# Altium footprint library OSHW_LuxonisMaster_20201223.PcbLib: 112 footprints (part 6 of 7)
Each footprint in its own frame and in the unit in brackets; x right, y up, seen from the top. Pads: shape width x height; smd on the part's side, far side on the other; paste and mask are expansions set on the pad; w line width, h text height; cw(c..) or ccw(c..) is an arc to the next point about the centre after c.
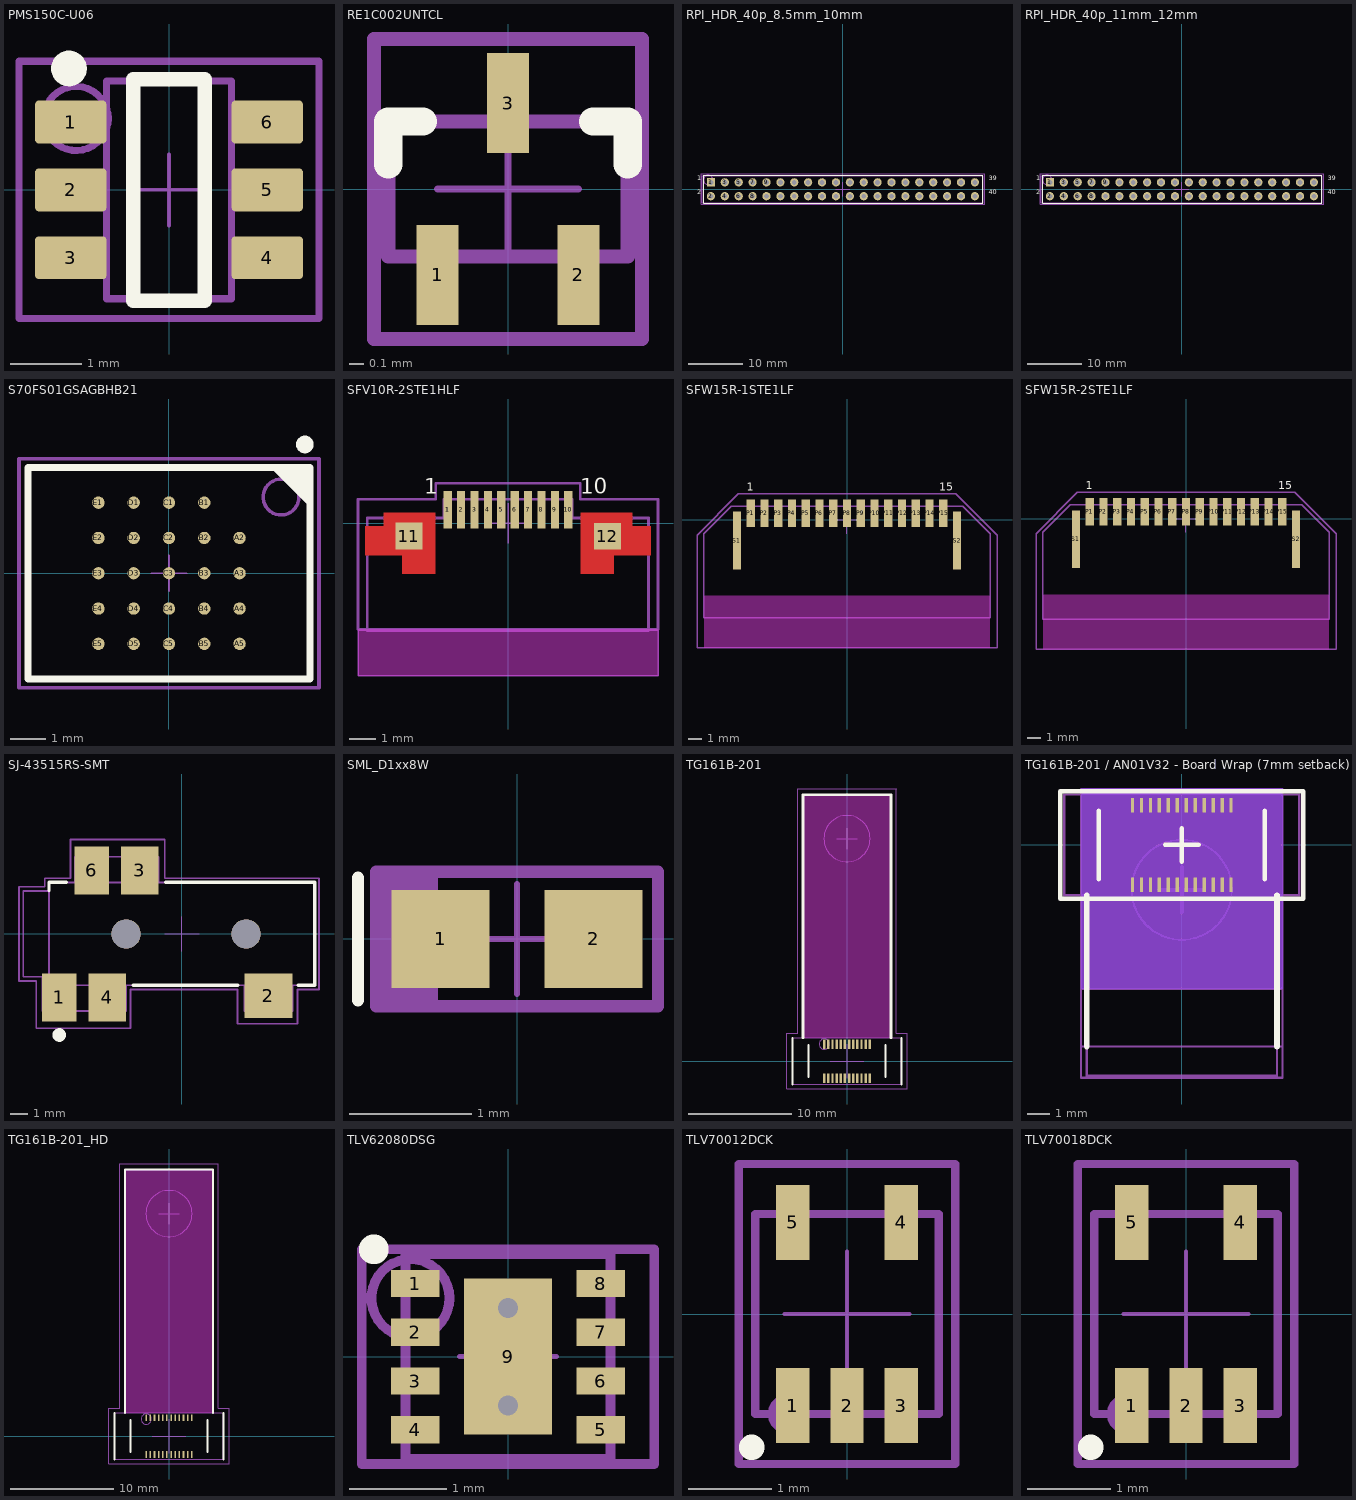
[diagram p5: the footprints below, top view; thin cyan lines are the x and y axes]

## PMS150C-U06 [mm] "SOT23-6 60mil"
height 1.524
pads (6):
  rrect17% 1x0.6 smd: 1(-1.375,0.95) 2(-1.375,0) 3(-1.375,-0.95) 4(1.375,-0.95) 5(1.375,0) 6(1.375,0.95)
Top Overlay:
  circle w0.25: c-1.4,1.7 r0.125
  lines w0.2: -0.5,-1.55 -0.5,1.55 0.5,1.55 0.5,-1.55 -0.5,-1.55
Top Assembly:
  circle w0.1: c-1.3,1 r0.449
  lines w0.1: -2.1,-1.8 -2.1,1.8 2.1,1.8 2.1,-1.8 -2.1,-1.8
  text ".Designator" at 0,0 h1
Top Courtyard:
  lines w0.05: -0.5,0 0.5,0 ; 0,-0.5 0,0.5 ; -2.1,-1.8 -2.1,1.8 2.1,1.8 2.1,-1.8 -2.1,-1.8
Top Component Outline:
  lines w0.1: -0.875,-1.525 -0.875,1.525 0.875,1.525 0.875,-1.525 -0.875,-1.525
3D body "DBV0006AakaMF06A.stp": height 1.11, standoff -0.01, extent -1.422,-1.461 1.422,1.46

## RE1C002UNTCL [mm] "ROHM SOT-416FL"
height 0.85
pads (3):
  rect 0.3x0.71 smd: 1(-0.5,-0.61) 2(0.5,-0.61) 3(0,0.61)
Top Overlay:
  lines w0.2: -0.85,0.175 -0.85,0.48 -0.605,0.48 ; 0.605,0.48 0.85,0.48 0.85,0.175
Top Assembly:
  lines w0.1: -0.95,-1.065 -0.95,1.065 0.95,1.065 0.95,-1.065 -0.95,-1.065
  text "'.Designator'" at 0,0 h1
Top Courtyard:
  lines w0.05: -0.5,0 0.5,0 ; 0,-0.5 0,0.5 ; -0.95,-1.065 0.95,-1.065 0.95,1.065 -0.95,1.065 -0.95,-1.065
Top Component Outline:
  lines w0.1: -0.85,-0.48 -0.85,0.48 0.85,0.48 0.85,-0.48 -0.85,-0.48
3D body "Trans_ROHM_RE1C002UNTCL_eec.STEP": height 0.25, standoff 0, extent -0.95,-1.065 0.95,1.065

## RPI_HDR_40p_8.5mm_10mm [mm] "RPI Header / 40pins / 8.5mm housing, / 10mm pin"
height 18.5
pads (40):
  rect 1.5x1.5 hole 0.9: 1(-24.13,1.27)
  round 1.5 hole 0.9: 2(-24.13,-1.27) 3(-21.59,1.27) 4(-21.59,-1.27) 5(-19.05,1.27) 6(-19.05,-1.27) 7(-16.51,1.27) 8(-16.51,-1.27) 9(-13.97,1.27) 10(-13.97,-1.27) 11(-11.43,1.27) 12(-11.43,-1.27) 13(-8.89,1.27) 14(-8.89,-1.27) 15(-6.35,1.27) 16(-6.35,-1.27) 17(-3.81,1.27) 18(-3.81,-1.27) 19(-1.27,1.27) 20(-1.27,-1.27) 21(1.27,1.27) 22(1.27,-1.27) 23(3.81,1.27) 24(3.81,-1.27) 25(6.35,1.27) 26(6.35,-1.27) 27(8.89,1.27) 28(8.89,-1.27) 29(11.43,1.27) 30(11.43,-1.27) 31(13.97,1.27) 32(13.97,-1.27) 33(16.51,1.27) 34(16.51,-1.27) 35(19.05,1.27) 36(19.05,-1.27) 37(21.59,1.27) 38(21.59,-1.27) 39(24.13,1.27) 40(24.13,-1.27)
Top Overlay:
  lines w0.2: -25.4,-2.54 -25.4,2.54 25.527,2.54 25.527,-2.54 -25.4,-2.54
  text "2" at -26.67,-1.27 h1.5
  text "40" at 26.67,-1.27 h1.5
  text "1" at -26.67,1.27 h1.5
  text "39" at 26.67,1.27 h1.5
Bottom Overlay:
  text "40" at 26.67,-1.27 h1.5
  text "39" at 26.67,1.27 h1.5
  text "2" at -26.67,-1.27 h1.5
  text "1" at -26.67,1.27 h1.5
Top Assembly:
  circle w0.1: c-24.6,1.7 r0.86
  lines w0.1: -25.9,2.6 -25.9,2.8 25.9,2.8 25.9,-2.7 -25.6,-2.7 -25.9,-2.7 -25.9,2.5 -25.9,2.7
  text "'.Designator'" at 0,0 h1
Top Courtyard:
  lines w0.05: -25.9,2.6 -25.9,2.8 25.9,2.8 25.9,-2.7 -25.6,-2.7 -25.9,-2.7 -25.9,2.5 -25.9,2.7 ; -1.27,0 0,0 ; 0,-1.27 0,0 ; 0,1.27 0,0 ; 1.27,0 0,0 ; 0,0 0,0
Top Component Outline:
  lines w0.1: -25.7,-2.5 -25.7,2.5 25.7,2.5 25.7,-2.5 -25.7,-2.5
3D body "SSQ-120-23-G-D.stp": height 8.51, standoff -10.01, extent -25.654,-2.477 25.654,2.477

## RPI_HDR_40p_11mm_12mm [mm] "RPI Header / 40pins / 11mm housing, / 12mm pin"
height 23
pads (40):
  rect 1.5x1.5 hole 0.9: 1(-24.13,1.27)
  round 1.5 hole 0.9: 2(-24.13,-1.27) 3(-21.59,1.27) 4(-21.59,-1.27) 5(-19.05,1.27) 6(-19.05,-1.27) 7(-16.51,1.27) 8(-16.51,-1.27) 9(-13.97,1.27) 10(-13.97,-1.27) 11(-11.43,1.27) 12(-11.43,-1.27) 13(-8.89,1.27) 14(-8.89,-1.27) 15(-6.35,1.27) 16(-6.35,-1.27) 17(-3.81,1.27) 18(-3.81,-1.27) 19(-1.27,1.27) 20(-1.27,-1.27) 21(1.27,1.27) 22(1.27,-1.27) 23(3.81,1.27) 24(3.81,-1.27) 25(6.35,1.27) 26(6.35,-1.27) 27(8.89,1.27) 28(8.89,-1.27) 29(11.43,1.27) 30(11.43,-1.27) 31(13.97,1.27) 32(13.97,-1.27) 33(16.51,1.27) 34(16.51,-1.27) 35(19.05,1.27) 36(19.05,-1.27) 37(21.59,1.27) 38(21.59,-1.27) 39(24.13,1.27) 40(24.13,-1.27)
Top Overlay:
  lines w0.2: -25.4,-2.54 -25.4,2.54 25.527,2.54 25.527,-2.54 -25.4,-2.54
  text "2" at -26.67,-1.27 h1.5
  text "40" at 26.67,-1.27 h1.5
  text "1" at -26.67,1.27 h1.5
  text "39" at 26.67,1.27 h1.5
Bottom Overlay:
  text "40" at 26.67,-1.27 h1.5
  text "39" at 26.67,1.27 h1.5
  text "2" at -26.67,-1.27 h1.5
  text "1" at -26.67,1.27 h1.5
Top Assembly:
  circle w0.1: c-24.6,1.7 r0.86
  lines w0.1: -25.9,2.6 -25.9,2.8 25.9,2.8 25.9,-2.7 -25.6,-2.7 -25.9,-2.7 -25.9,2.5 -25.9,2.7
  text "'.Designator'" at 0,0 h1
Top Courtyard:
  lines w0.05: -25.9,2.6 -25.9,2.8 25.9,2.8 25.9,-2.7 -25.6,-2.7 -25.9,-2.7 -25.9,2.5 -25.9,2.7 ; -1.27,0 0,0 ; 0,-1.27 0,0 ; 0,1.27 0,0 ; 1.27,0 0,0 ; 0,0 0,0
Top Component Outline:
  lines w0.1: -25.7,-2.5 -25.7,2.5 25.7,2.5 25.7,-2.5 -25.7,-2.5
3D body "RPI_Header_ELEDIY_11mmHousing_12mmPins v1.step": height 11.49, standoff -11.56, extent -25.7,-2.5 25.7,2.5

## S70FS01GSAGBHB21 [mm] "BGA, 24-Leads, Body 6.00x8.00mmx1.20mm, Pitch 1.00mm"
height 1.2
pads (24):
  round 0.35 smd: A2(2,1) A3(2,0) A4(2,-1) A5(2,-2) B1(1,2) B2(1,1) B3(1,0) B4(1,-1) B5(1,-2) C1(0,2) C2(0,1) C3(0,0) C4(0,-1) C5(0,-2) D1(-1,2) D2(-1,1) D3(-1,0) D4(-1,-1) D5(-1,-2) E1(-2,2) E2(-2,1) E3(-2,0) E4(-2,-1) E5(-2,-2)
Top Overlay:
  circle w0.25: c3.85,3.65 r0.125
  region: 4,2 3,3 4,3
  lines w0.2: 3,3 4,2 ; -4,-3 -4,3 4,3 4,-3 -4,-3
Top Assembly:
  circle w0.1: c3.175,2.159 r0.508
  lines w0.1: -4.25,-3.25 -4.25,3.25 4.25,3.25 4.25,-3.25 -4.25,-3.25
  text "'.Designator'" at 0,0 h1
Top Courtyard:
  lines w0.05: -0.5,0 0.5,0 ; 0,-0.5 0,0.5 ; -4.25,-3.25 -4.25,3.25 4.25,3.25 4.25,-3.25 -4.25,-3.25
Top Component Outline:
  lines w0.1: -4,-3 -4,3 4,3 4,-3 -4,-3
3D body: height 1.2, standoff 0.2, extent -4,-3 4,3

## SFV10R-2STE1HLF [mm] "CONN FFC TOP 10POS 0.50MM R/A"
height 2
pads (13):
  rect 0.305x1.405 smd: 1(-2.258,0.494) 1(-2.258,0.494) 2(-1.759,0.494) 3(-1.258,0.494) 4(-0.758,0.494) 5(-0.258,0.494) 6(0.242,0.494) 7(0.741,0.494) 8(1.242,0.494) 9(1.742,0.494) 10(2.242,0.494)
  rect 1x1 smd: 11(-3.707,-0.486) 12(3.708,-0.494)
Top Layer:
  region: 3.942,0.395 2.692,0.395 2.692,-1.905 3.942,-1.905
  region: 5.342,-0.105 2.692,-0.105 2.692,-1.205 5.342,-1.205
  region: 4.642,0.395 2.692,0.395 2.692,-1.205 4.642,-1.205
  rectangle: -4.658,-1.205 -2.708,0.395
  rectangle: -5.358,-1.205 -2.708,-0.105
  rectangle: -3.958,-1.906 -2.708,0.395
  region: 4.346,2.653
  region: 5.215,-0.232
  region: -5.231,-0.232
Top Overlay:
  text "10" at 2.694,0.892 h1
  text "1" at -3.137,0.892 h1
Top Paste:
  region: 5.342,-0.105 2.692,-0.105 2.692,-1.205 5.342,-1.205
  region: 4.642,0.395 2.692,0.395 2.692,-1.205 4.642,-1.205
  region: 3.942,0.395 2.692,0.395 2.692,-1.905 3.942,-1.905
  rectangle: -5.358,-1.205 -2.708,-0.105
  rectangle: -4.658,-1.205 -2.708,0.395
  rectangle: -3.958,-1.906 -2.708,0.395
Keep-Out Layer:
  region: 5.594,-5.708 5.594,-3.973 -5.611,-3.973 -5.611,-5.708
Top Assembly:
  lines w0.1: -5.611,-3.973 -5.611,0.892 -2.711,0.892 -2.711,1.492 2.694,1.492 2.694,0.892 5.594,0.892 5.594,-3.973 -5.611,-3.973
  text "'.Designator'" at 0,0 h1
Assembly Notes:
  text "Top contact ffc" at -2.756,-3.708 h1
Top Courtyard:
  lines w0.05: -0.75,0 0,0 ; 0,-0.75 0,0 ; 0,0.75 0,0 ; 0.75,0 0,0 ; -5.611,-5.708 -5.611,0.892 -5.261,0.892 -2.711,0.892 -2.711,1.492 2.694,1.492 2.694,0.892 5.244,0.892 5.594,0.892 5.594,-5.708 -5.611,-5.708
Top Component Outline:
  lines w0.1: 5.239,0.192 5.239,-4.008 -5.261,-4.008 -5.261,0.192 -2.411,0.192 -2.411,0.892 2.394,0.892 2.394,0.192 5.244,0.192
3D body "ssfv10r_2stlf.stp": height 1.82, standoff -0.05, extent -5.261,-4.008 5.239,0.892

## SFW15R-1STE1LF [mm] "RPi Cam 15pin 2 lane MIPI bottom contact"
height 2.7
pads (17):
  rect 0.6x2 smd: P1(-7,0.5) P2(-6,0.5) P3(-5,0.5) P4(-4,0.5) P5(-3,0.5) P6(-2,0.5) P7(-1,0.5) P8(0,0.5) P9(1,0.5) P10(2,0.5) P11(3,0.5) P12(4,0.5) P13(5,0.5) P14(6,0.5) P15(7,0.5)
  rect 0.6x4.2 smd: S1(-8,-1.5) S2(8,-1.5)
Top Layer keep-out:
  rectangle: -10.4,-9.3 10.4,-5.5
Top Overlay:
  text "1" at -7.3,1.9 h1
  text "15" at 6.7,1.9 h1
Top Assembly:
  lines w0.1: -10.9,-9.3 10.9,-9.3 10.9,-1.1 7.9,1.9 -7.9,1.9 -10.9,-1.1 -10.9,-9.3
  text "'.Designator'" at 0,0 h1
Assembly Notes:
  text "Keepout: flex cable region" at -10.4,-9.3 h1
Top Courtyard:
  lines w0.05: -1,0 0,0 ; 0,-1 0,0 ; 0,1 0,0 ; 1,0 0,0 ; -10.9,-9.3 10.9,-9.3 10.9,-1.1 7.9,1.9 -7.9,1.9 -10.9,-1.1 -10.9,-9.3
Top Component Outline:
  lines w0.1: -10.4,-7.1 10.4,-7.1 10.4,-1 8.4,1 -8.4,1 -10.4,-1 -10.4,-7.1
  text "Slider open" at -10.1,-7.1 h1
3D body "ssfw15r_1_3st_lf.stp": height 2.7, standoff 0, extent -10.4,-5.5 10.4,1

## SFW15R-2STE1LF [mm] "RPi Cam 15pin 2 lane MIPI top contact"
height 2.7
pads (17):
  rect 0.6x2 smd: P1(-7,0.5) P2(-6,0.5) P3(-5,0.5) P4(-4,0.5) P5(-3,0.5) P6(-2,0.5) P7(-1,0.5) P8(0,0.5) P9(1,0.5) P10(2,0.5) P11(3,0.5) P12(4,0.5) P13(5,0.5) P14(6,0.5) P15(7,0.5)
  rect 0.6x4.2 smd: S1(-8,-1.5) S2(8,-1.5)
Top Layer keep-out:
  rectangle: -10.4,-9.5 10.4,-5.5
Top Overlay:
  text "1" at -7.3,1.9 h1
  text "15" at 6.7,1.9 h1
Top Assembly:
  lines w0.1: -10.9,-9.5 10.9,-9.5 10.9,-1.1 7.9,1.9 -7.9,1.9 -10.9,-1.1 -10.9,-9.5
  text "'.Designator'" at 0,0 h1
Assembly Notes:
  text "Keepout: flex cable region" at -10.4,-9.5 h1
Top Courtyard:
  lines w0.05: -1,0 0,0 ; 0,-1 0,0 ; 0,1 0,0 ; 1,0 0,0 ; -10.9,-9.5 10.9,-9.5 10.9,-1.1 7.9,1.9 -7.9,1.9 -10.9,-1.1 -10.9,-9.5
Top Component Outline:
  lines w0.1: -10.4,-7.3 10.4,-7.3 10.4,-1 8.4,1 -8.4,1 -10.4,-1 -10.4,-7.3
  text "Slider open" at -10.1,-7.1 h1
3D body "ssfw15r_2_4st_lf.stp": height 2.7, standoff 0, extent -10.4,-5.5 10.4,1

## SJ-43515RS-SMT [mm] "CUI_SJ-43515RS-SMT"
pads (7):
  rect 2x2.8 smd: 1(-7.15,-3.7) 6(-5.25,3.7)
  rect 2.8x2.6 smd: 2(5.05,-3.6)
  rect 2.2x2.8 smd: 3(-2.45,3.7) 4(-4.35,-3.7)
  round 1.7 hole 1.7 unplated: ""(-3.25,0) ""(3.75,0)
Top Overlay:
  circle w0.4: c-7.15,-5.9 r0.2
  lines w0.2: -7.75,2.5 -7.75,3 -6.75,3 ; -2.85,-3 3.25,-3 ; -0.95,3 7.75,3 7.75,2.55 ; 6.8,-3 7.75,-3 7.75,2.5
Top Assembly:
  lines w0.1: -7.75,-2.5 -9.25,-2.5 -9.25,2.5 -7.75,2.5 ; -7.75,-2.5 -7.75,2.5 ; -7.75,-2.5 -7.75,-3 7.75,-3 7.75,3 -7.75,3 -7.75,2.5 ; -9.5,-2.75 -9.5,2.75 -8,2.75 -8,3.25 -6.5,3.25 -6.5,5.5 -1,5.5 -1,3.25 8,3.25 8,-3.25 6.75,-3.25 6.75,-5.25 3.25,-5.25 3.25,-3.25 -3,-3.25 -3,-5.5 -8.5,-5.5 -8.5,-2.75 -9.5,-2.75
  text "'.Designator'" at 0,0 h1
Top Courtyard:
  lines w0.05: -1,0 0,0 ; 0,-1 0,0 ; 0,1 0,0 ; 1,0 0,0 ; -9.5,-2.75 -8.5,-2.75 -8.5,-5.5 -3,-5.5 -3,-3.25 3.25,-3.25 3.25,-5.25 6.75,-5.25 6.75,-3.25 8,-3.25 8,3.25 -1,3.25 -1,5.5 -6.5,5.5 -6.5,3.25 -8,3.25 -8,2.75 -9.5,2.75 -9.5,-2.75
Top Component Outline:
  lines w0.1: -9.25,-2.5 -9.25,2.5 -7.75,2.5 -7.75,3 -6.25,3 -6.25,4.5 -1.35,4.5 -1.35,3 7.75,3 7.75,-3 6.45,-3 6.45,-4.5 3.65,-4.5 3.65,-3 -3.25,-3 -3.25,-4.5 -8.15,-4.5 -8.15,-2.5 -9.25,-2.5
3D body "CUI_SJ-43515RS-SMT-TR.step": height 5.1, standoff -0.7, extent -9.45,-4.5 7.75,4.5

## SML_D1xx8W [mm] "Rohm LED SML_D1 series - Chip Diode, 2-Leads, Body 1.60x0.80mm, IPC High Density"
height 0.55
pads (2):
  rect 0.8x0.8 smd: 1(-0.625,0) 2(0.625,0)
Top Overlay:
  lines w0.1: -1.3,-0.5 -1.3,0.5
Top Assembly:
  rectangle: -1.15,-0.55 -0.698,0.55
  lines w0.1: -0.698,-0.55 -0.698,0.55 ; -1.15,-0.55 1.15,-0.55 1.15,0.55 -1.15,0.55 -1.15,-0.55
  text "'.Designator'" at 0,0 h1
Top Courtyard:
  lines w0.05: -0.45,0 0.45,0 ; 0,-0.45 0,0.45 ; -1.15,-0.55 1.15,-0.55 1.15,0.55 -1.15,0.55 -1.15,-0.55
3D body "User Library-LED_0603_WS.STEP": height 0.6, standoff 0, extent -0.8,-0.4 0.8,0.4

## TG161B-201 [mm]
pads (24):
  rect 0.23x0.92 smd mask+0.05: 1(-2.2,1.64) 2(-1.8,1.64) 3(-1.4,1.64) 4(-1,1.64) 5(-0.6,1.64) 6(-0.2,1.64) 7(0.2,1.64) 8(0.6,1.64) 9(1,1.64) 10(1.4,1.64) 11(1.8,1.64) 12(2.2,1.64) 13(2.2,-1.64) 14(1.8,-1.64) 15(1.4,-1.64) 16(1,-1.64) 17(0.6,-1.64) 18(0.2,-1.64) 19(-0.2,-1.64) 20(-0.6,-1.64) 21(-1,-1.64) 22(-1.4,-1.64) 23(-1.8,-1.64) 24(-2.2,-1.64)
Top Layer keep-out:
  rectangle: -4.25,2.25 4.25,17.25
  rectangle: -4.25,17.25 4.25,25.75
Top Overlay:
  lines w0.2: -5.25,-2.25 -5.25,2.25 ; -3.705,-1.53 -3.705,1.53 ; 3.705,-1.53 3.705,1.53 ; 5.25,-2.25 5.25,2.25
  lines w0.25: -4.25,2.25 -4.25,17.25 -4.25,25.75 4.25,25.75 4.25,17.25 4.25,2.25
Top Assembly:
  circle w0.1: c-2.2,1.64 r0.5
  circle w0.1: c0,21.5 r2.236
  lines w0.1: -1,21.5 1,21.5 ; 0,20.5 0,22.5 ; -4.25,2.25 -5.25,2.25 -5.25,-2.25 5.25,-2.25 5.25,2.25 4.25,2.25 ; -4.25,2.25 -4.25,25.75 4.25,25.75 ; -4.25,2.25 4.25,2.25 ; 4.25,2.25 4.25,25.75 ; 4.25,25.75 ccw(c4.25,25.75) 4.25,25.75
  text "'.Designator'" at 0,0 h1
Top Courtyard:
  circle w0.1: c0,21.5 r2.236
  lines w0.05: -1.639,0 0,0 ; -1,21.5 1,21.5 ; 0,-1.639 0,0 ; 0,1.639 0,0 ; 0,20.5 0,22.5 ; 1.639,0 0,0 ; 4.75,26.3 4.75,2.7 5.8,2.7 5.8,-2.7 -5.8,-2.7 -5.8,2.7 -4.75,2.7 -4.75,26.3 4.8,26.3
Top Component Outline:
  lines w0.1: -5.25,-2.25 5.25,-2.25 5.25,2.25 4.25,2.25 4.25,25.75 -4.25,25.75 -4.25,2.25 -5.25,2.25 -5.25,-2.25
3D body: height 3.4, standoff 1.7, extent -3.25,18.253 3.25,24.747
3D body: height 1.7, standoff 0, extent -4.25,17.25 4.25,25.75
3D body: height 4.4, standoff 1.7, extent -2.75,18.75 2.75,24.25
3D body: height 0.94, standoff 0.84, extent -5.25,-2.25 5.25,25.75
3D body "ACON_BBR43-24KB533_revB_dwg_no_C-BBR43-04-01.STEP": height 0.92, standoff 0, extent -3.705,-1.87 3.705,1.87

## TG161B-201 / AN01V32 - Board Wrap (7mm setback) MinPads [mm] "SMT connector: BBR43-24KB533, 7mm camera setback"
pads (24):
  rect 0.15x0.65 smd mask+0.05: 1(2.2,-1.775) 2(1.8,-1.775) 3(1.4,-1.775) 4(1,-1.775) 5(0.6,-1.775) 6(0.2,-1.775) 7(-0.2,-1.775) 8(-0.6,-1.775) 9(-1,-1.775) 10(-1.4,-1.775) 11(-1.8,-1.775) 12(-2.2,-1.775) 13(-2.2,1.775) 14(-1.8,1.775) 15(-1.4,1.775) 16(-1,1.775) 17(-0.6,1.775) 18(-0.2,1.775) 19(0.2,1.775) 20(0.6,1.775) 21(1,1.775) 22(1.4,1.775) 23(1.8,1.775) 24(2.2,1.775)
Bottom Layer keep-out:
  region: 4.5,2.5 -4.5,2.5 -4.5,-6.425 4.5,-6.425
Top Overlay:
  lines w0.2: -3.705,-1.53 -3.705,1.53 ; -0.75,0 0,0 ; 0,-0.75 0,0 ; 0,0.75 0,0 ; 0.75,0 0,0 ; 3.705,-1.53 3.705,1.53 ; -5.425,-2.4 5.425,-2.4 5.425,2.4 -5.425,2.4 -5.425,-2.4
  lines w0.25: -4.25,-9 -4.25,-2.25 ; 4.25,-9 4.25,-2.25
Bottom Overlay:
  lines w0.25: -4.25,-9 -4.25,-6.25 ; 4.25,-9 4.25,-6.25 ; -4.25,-6.25 4.25,-6.25 ; -4.25,-6.25 -4.25,2.25 4.25,2.25 4.25,-6.25
Keep-Out Layer:
  region: 5.8,-10.9
Top Assembly:
  lines w0.1: -4.5,-2.425 -4.5,-9 ; 4.5,-2.425 4.5,-9 ; -4.5,-9 -4.5,-10.4 4.5,-10.4 4.5,-9 ; -4.5,-9 4.5,-9 ; 4.5,-9 4.5,-9 ; -5.425,-2.425 5.425,-2.425 5.425,2.425 -5.425,2.425 -5.425,-2.425
  text "'.Designator'" at 0,0 h1
  text "Board edge" at -1.1,-8.9 h0.5
  text "Flex edge" at -0.9,-10.3 h0.5
Bottom Assembly:
  circle w0.1: c0,-2 r2.236
  lines w0.1: -4.5,-9 4.5,-9 ; -4.5,-9 -4.5,2.5 4.5,2.5 4.5,-9 ; -4.5,-9 -4.5,-10.4 4.5,-10.4 4.5,-9
  lines w0.2: -1,-2 1,-2 ; 0,-3 0,-1
  text "Board edge" at 1.1,-8.9 h0.5
  text "Flex edge" at 0.9,-10.3 h0.5
Top Courtyard:
  lines w0.05: -4.5,-9 -4.5,-2.425 ; -0.8,0 0.8,0 ; 0,-0.8 0,0.8 ; 4.5,-9 4.5,-2.425 ; -5.425,-2.425 5.425,-2.425 5.425,2.425 -5.425,2.425 -5.425,-2.425
Bottom Courtyard:
  lines w0.05: -4.5,-9 -4.5,2.5 4.5,2.5 4.5,-9
Top Component Outline:
  lines w0.1: -5.25,-2.25 -5.25,2.25 5.25,2.25 5.25,-2.25 4.25,-2.25 4.25,-10.31 -4.25,-10.31 -4.25,-2.25 -5.25,-2.25
Bottom Component Outline:
  lines w0.1: -4.5,-6.425 -4.5,2.5 4.5,2.5 4.5,-6.425 -4.5,-6.425
3D body: height 3.4, standoff 1.7, extent -3.25,-5.247 3.25,1.247
3D body: height 1.7, standoff 0, extent -4.25,-6.25 4.25,2.25
3D body: height 0.34, standoff 0.24, extent -4.25,-10.31 4.25,-6.25
3D body: height 0.94, standoff -1.94, extent -4.25,-10.41 4.25,-10.31
3D body: height 4.4, standoff 1.7, extent -2.75,-4.75 2.75,0.75
3D body: height 0.94, standoff 0.84, extent -4.25,-10.31 4.25,-2.25
3D body: height 0.94, standoff 0.84, extent -5.25,-2.25 5.25,2.25

## TG161B-201_HD [mm] "IPC High density version"
pads (24):
  rect 0.15x0.65 smd mask+0.05: 1(-2.2,1.775) 2(-1.8,1.775) 3(-1.4,1.775) 4(-1,1.775) 5(-0.6,1.775) 6(-0.2,1.775) 7(0.2,1.775) 8(0.6,1.775) 9(1,1.775) 10(1.4,1.775) 11(1.8,1.775) 12(2.2,1.775) 13(2.2,-1.775) 14(1.8,-1.775) 15(1.4,-1.775) 16(1,-1.775) 17(0.6,-1.775) 18(0.2,-1.775) 19(-0.2,-1.775) 20(-0.6,-1.775) 21(-1,-1.775) 22(-1.4,-1.775) 23(-1.8,-1.775) 24(-2.2,-1.775)
Top Layer keep-out:
  rectangle: -4.25,17.25 4.25,25.75
  rectangle: -4.25,2.25 4.25,17.25
Top Overlay:
  lines w0.2: -5.25,-2.25 -5.25,2.25 ; -4.25,2.25 -4.25,17.25 -4.25,25.75 4.25,25.75 4.25,17.25 4.25,2.25 ; -3.705,-1.53 -3.705,1.53 ; 3.705,-1.53 3.705,1.53 ; 5.25,-2.25 5.25,2.25
Top Assembly:
  circle w0.1: c0,21.5 r2.236
  circle w0.1: c-2.2,1.64 r0.5
  lines w0.1: -1,21.5 1,21.5 ; 0,20.5 0,22.5 ; -4.25,2.25 4.25,2.25 ; -4.25,2.25 -4.25,25.75 4.25,25.75 ; -4.25,2.25 -5.25,2.25 -5.25,-2.25 5.25,-2.25 5.25,2.25 4.25,2.25 ; 4.25,2.25 4.25,25.75 ; 4.25,25.75 ccw(c4.25,25.75) 4.25,25.75
  text "'.Designator'" at 0,0 h1
Top Courtyard:
  circle w0.05: c0,21.5 r2.236
  lines w0.05: -1.639,0 0,0 ; -1,21.5 1,21.5 ; 0,-1.639 0,0 ; 0,1.639 0,0 ; 0,20.5 0,22.5 ; 1.639,0 0,0 ; -5.8,-2.7 -5.8,2.7 -4.75,2.7 -4.75,26.3 4.75,26.3 4.75,2.7 5.8,2.7 5.8,-2.7 -5.8,-2.7
Top Component Outline:
  lines w0.1: -5.25,-2.25 -5.25,2.25 -4.25,2.25 -4.25,25.75 4.25,25.75 4.25,2.25 5.25,2.25 5.25,-2.25 -5.25,-2.25
3D body "Sunny_AN01V32-0JG v6.step": height 4.14, standoff 0, extent -5.35,-2.353 5.35,25.85

## TLV62080DSG [mm] "WSON-8, 2.1mm x 2.1mm x 0.8mm"
height 0.8
pads (9):
  rect 0.5x0.28 smd mask+0.07: 1(-0.95,0.75) 2(-0.95,0.25) 3(-0.95,-0.25) 4(-0.95,-0.75) 5(0.95,-0.75) 6(0.95,-0.25) 7(0.95,0.25) 8(0.95,0.75)
  rect 0.9x1.6 smd mask+0.07: 9(0,0)
via 0,0.5 diameter 0.406 hole 0.203
via 0,-0.5 diameter 0.406 hole 0.203
Top Overlay:
  circle w0.254: c-1.375,1.1 r0.025
Top Paste:
  pour cut-out: 0.7,1.975
Top Assembly:
  circle w0.1: c-1,0.6 r0.4
  lines w0.1: -1.5,-1.1 1.5,-1.1 1.5,1.1 -1.5,1.1 -1.5,-1.1
  text "'.Designator'" at 0,0 h1
Top Courtyard:
  lines w0.05: -0.5,0 0.5,0 ; 0,-0.5 0,0.5 ; -1.5,-1.1 1.5,-1.1 1.5,1.1 -1.5,1.1 -1.5,-1.1
Top Component Outline:
  lines w0.1: -1.05,-1.05 -1.05,1.05 1.05,1.05 1.05,-1.05 -1.05,-1.05
3D body: height 0.8, standoff 0.05, extent -1.05,-1.05 1.05,1.05

## TLV70012DCK [mm] "SC70-5 1.1mm"
height 1.1
pads (5):
  rect 0.4x0.9 smd paste-0.025 mask+0.05: 1(-0.65,-1.1) 2(0,-1.1) 3(0.65,-1.1) 4(0.65,1.1) 5(-0.65,1.1)
Top Overlay:
  circle w0.254: c-1.143,-1.6 r0.025
Top Assembly:
  circle w0.1: c-0.7,-1.2 r0.2
  lines w0.1: -1.3,-1.8 -1.3,1.8 1.3,1.8 1.3,-1.8 -1.3,-1.8
  text "'.Designator'" at 0,0 h1
Top Courtyard:
  lines w0.05: -0.75,0 0,0 ; 0,-0.75 0,0 ; 0,0.75 0,0 ; 0.75,0 0,0 ; -1.3,-1.8 1.3,-1.8 1.3,1.8 -1.3,1.8 -1.3,-1.8
Top Component Outline:
  lines w0.1: -1.1,-1.2 1.1,-1.2 1.1,1.2 -1.1,1.2 -1.1,-1.2
3D body "User Library-SOT353-1.step": height 1.1, standoff 0, extent -1.1,-1.2 1.1,1.2

## TLV70018DCK [mm] "SC70-5 1.1mm"
height 1.1
pads (5):
  rect 0.4x0.9 smd paste-0.025 mask+0.05: 1(-0.65,-1.1) 2(0,-1.1) 3(0.65,-1.1) 4(0.65,1.1) 5(-0.65,1.1)
Top Overlay:
  circle w0.254: c-1.143,-1.6 r0.025
Top Assembly:
  circle w0.1: c-0.7,-1.2 r0.2
  lines w0.1: -1.3,-1.8 1.3,-1.8 1.3,1.8 -1.3,1.8 -1.3,-1.8
  text "'.Designator'" at 0,0 h1
Top Courtyard:
  lines w0.05: -0.75,0 0,0 ; 0,-0.75 0,0 ; 0,0.75 0,0 ; 0.75,0 0,0 ; -1.3,-1.8 -1.3,1.8 1.3,1.8 1.3,-1.8 -1.3,-1.8
Top Component Outline:
  lines w0.1: -1.1,-1.2 -1.1,1.2 1.1,1.2 1.1,-1.2 -1.1,-1.2
3D body "User Library-SOT353-1.step": height 1.1, standoff 0, extent -1.1,-1.2 1.1,1.2